# Altium footprint library Connectors_2,54mm.PcbLib: 400 footprints (part 18 of 26)
Each footprint in its own frame and in the unit in brackets; x right, y up, seen from the top. Pads: shape width x height; smd on the part's side, far side on the other; paste and mask are expansions set on the pad; w line width, h text height; cw(c..) or ccw(c..) is an arc to the next point about the centre after c.
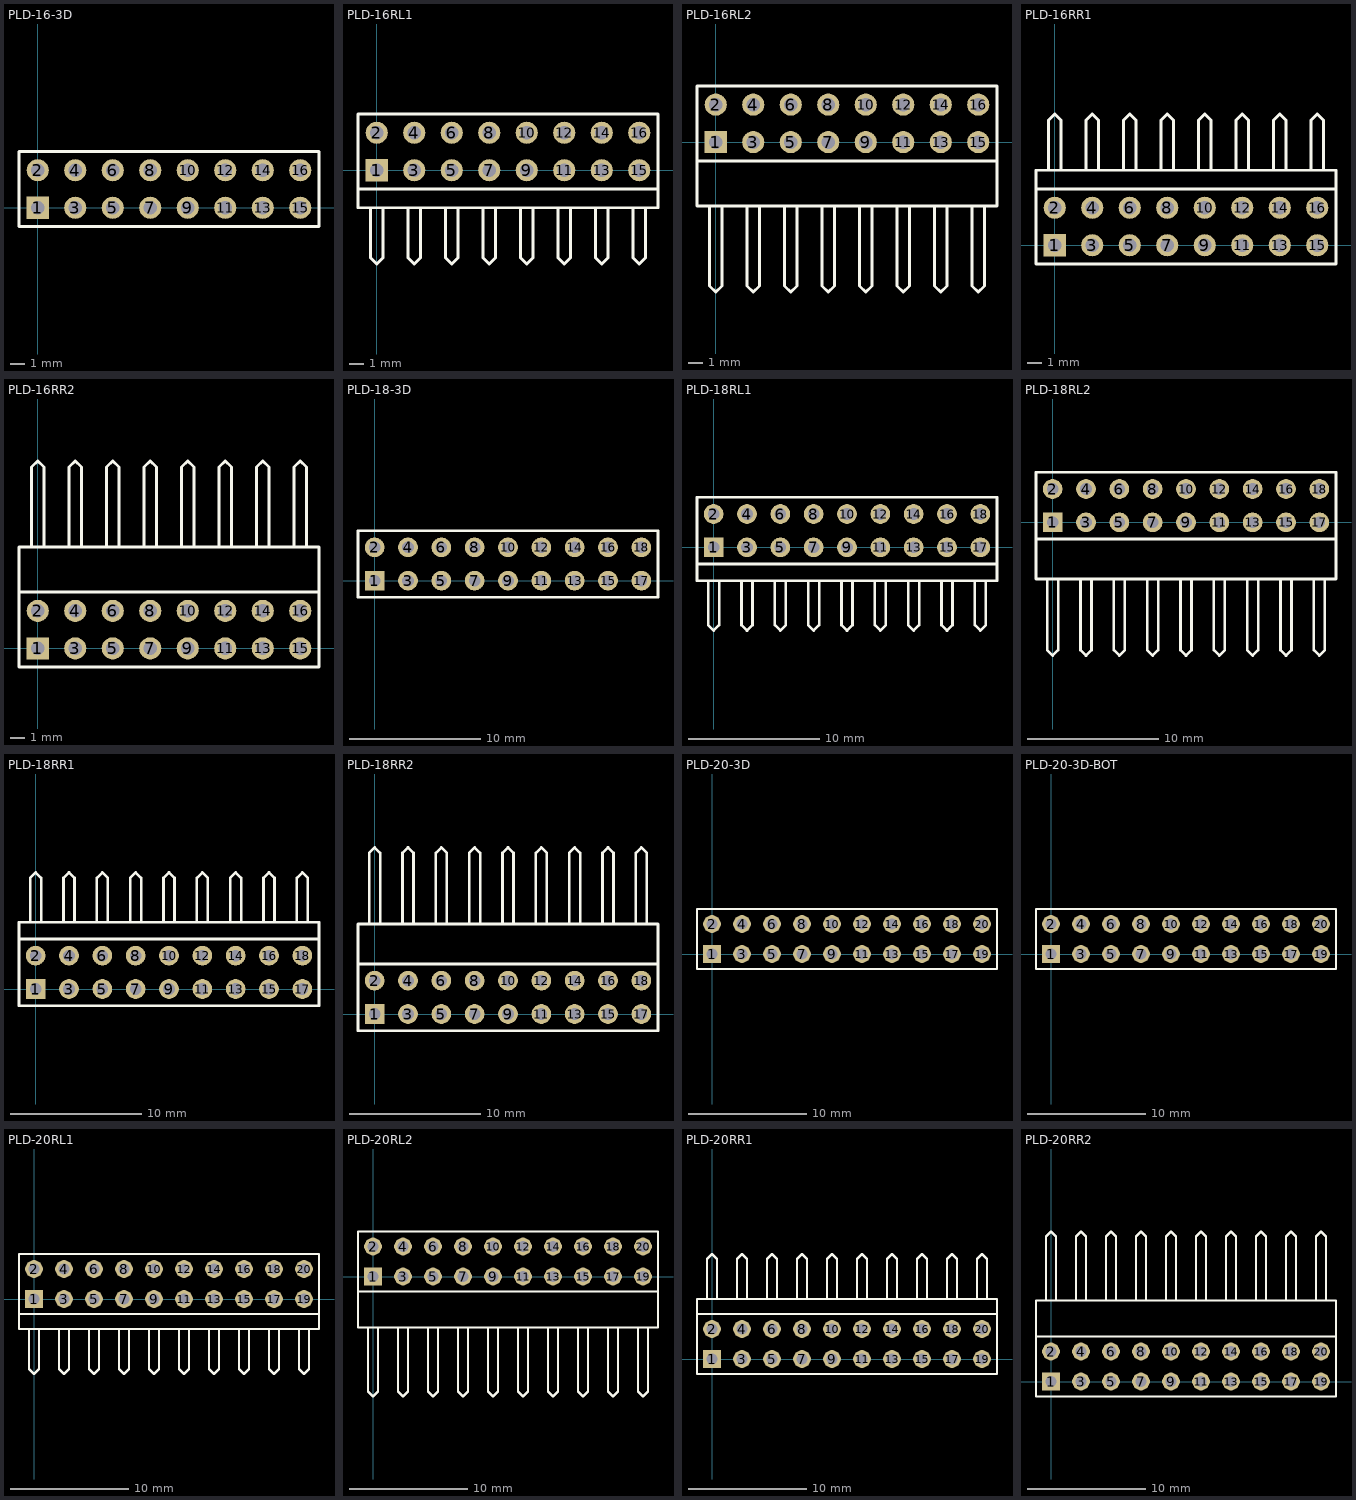
[diagram p17: the footprints below, top view; thin cyan lines are the x and y axes]

## PLD-16-3D [mm] "Connector; Header; 8x2 Position"
height 7.5
pads (16):
  rect 1.5x1.5 hole 0.9: 1(0,0)
  round 1.5 hole 0.9: 2(0,2.54) 3(2.54,0) 4(2.54,2.54) 5(5.08,0) 6(5.08,2.54) 7(7.62,0) 8(7.62,2.54) 9(10.16,0) 10(10.16,2.54) 11(12.7,0) 12(12.7,2.54) 13(15.24,0) 14(15.24,2.54) 15(17.78,0) 16(17.78,2.54)
Top Overlay:
  lines w0.2: -1.27,-1.27 19.05,-1.27 19.05,3.81 -1.27,3.81 -1.27,-1.27
3D body "PLD-16.step": height 8.4, standoff -3, extent -1.27,-1.23 19.05,3.77

## PLD-16RL1 [mm] "Connector; Header; 8x2 Position"
height 7
pads (16):
  rect 1.5x1.5 hole 0.9: 1(0,0)
  round 1.5 hole 0.9: 2(0,2.54) 3(2.54,0) 4(2.54,2.54) 5(5.08,0) 6(5.08,2.54) 7(7.62,0) 8(7.62,2.54) 9(10.16,0) 10(10.16,2.54) 11(12.7,0) 12(12.7,2.54) 13(15.24,0) 14(15.24,2.54) 15(17.78,0) 16(17.78,2.54)
Top Overlay:
  lines w0.2: -0.423,-2.54 -0.423,-5.927 0,-6.35 0.423,-5.927 0.423,-2.54 ; 2.117,-2.54 2.117,-5.927 2.54,-6.35 2.963,-5.927 2.963,-2.54 ; 4.657,-2.54 4.657,-5.927 5.08,-6.35 5.503,-5.927 5.503,-2.54 ; 7.197,-2.54 7.197,-5.927 7.62,-6.35 8.043,-5.927 8.043,-2.54 ; 9.737,-2.54 9.737,-5.927 10.16,-6.35 10.583,-5.927 10.583,-2.54 ; 12.277,-2.54 12.277,-5.927 12.7,-6.35 13.123,-5.927 13.123,-2.54 ; 14.817,-2.54 14.817,-5.927 15.24,-6.35 15.663,-5.927 15.663,-2.54 ; 17.357,-2.54 17.357,-5.927 17.78,-6.35 18.203,-5.927 18.203,-2.54 ; -1.27,-1.27 -1.27,-2.54 19.05,-2.54 19.05,-1.27 ; -1.27,-1.27 -1.27,3.81 19.05,3.81 19.05,-1.27 ; -1.27,-1.27 19.05,-1.27
3D body "PLS-1R.step": height 5.45, standoff -3, extent -1.27,-7.35 1.27,1.27
3D body "PLS-1Rr.stp": height 7.99, standoff -3, extent -1.27,-7.35 1.27,3.81
3D body "PLS-1Rr.stp": height 7.99, standoff -3, extent 1.27,-7.35 3.81,3.81
3D body "PLS-1R.step": height 5.45, standoff -3, extent 1.27,-7.35 3.81,1.27
3D body "PLS-1R.step": height 5.45, standoff -3, extent 3.81,-7.35 6.35,1.27
3D body "PLS-1Rr.stp": height 7.99, standoff -3, extent 3.81,-7.35 6.35,3.81
3D body "PLS-1Rr.stp": height 7.99, standoff -3, extent 6.35,-7.35 8.89,3.81
3D body "PLS-1R.step": height 5.45, standoff -3, extent 6.35,-7.35 8.89,1.27
3D body "PLS-1R.step": height 5.45, standoff -3, extent 8.89,-7.35 11.43,1.27
3D body "PLS-1Rr.stp": height 7.99, standoff -3, extent 8.89,-7.35 11.43,3.81
3D body "PLS-1Rr.stp": height 7.99, standoff -3, extent 11.43,-7.35 13.97,3.81
3D body "PLS-1R.step": height 5.45, standoff -3, extent 11.43,-7.35 13.97,1.27
3D body "PLS-1R.step": height 5.45, standoff -3, extent 13.97,-7.35 16.51,1.27
3D body "PLS-1Rr.stp": height 7.99, standoff -3, extent 13.97,-7.35 16.51,3.81
3D body "PLS-1Rr.stp": height 7.99, standoff -3, extent 16.51,-7.35 19.05,3.81
3D body "PLS-1R.step": height 5.45, standoff -3, extent 16.51,-7.35 19.05,1.27

## PLD-16RL2 [mm] "Connector; Header; 8x2 Position"
height 5
pads (16):
  rect 1.5x1.5 hole 0.9: 1(0,0)
  round 1.5 hole 0.9: 2(0,2.54) 3(2.54,0) 4(2.54,2.54) 5(5.08,0) 6(5.08,2.54) 7(7.62,0) 8(7.62,2.54) 9(10.16,0) 10(10.16,2.54) 11(12.7,0) 12(12.7,2.54) 13(15.24,0) 14(15.24,2.54) 15(17.78,0) 16(17.78,2.54)
Top Overlay:
  lines w0.2: -0.423,-4.318 -0.423,-9.737 0,-10.16 0.423,-9.737 0.423,-4.318 ; 2.117,-4.318 2.117,-9.737 2.54,-10.16 2.963,-9.737 2.963,-4.318 ; 4.657,-4.318 4.657,-9.737 5.08,-10.16 5.503,-9.737 5.503,-4.318 ; 7.197,-4.318 7.197,-9.737 7.62,-10.16 8.043,-9.737 8.043,-4.318 ; 9.737,-4.318 9.737,-9.737 10.16,-10.16 10.583,-9.737 10.583,-4.318 ; 12.277,-4.318 12.277,-9.737 12.7,-10.16 13.123,-9.737 13.123,-4.318 ; 14.817,-4.318 14.817,-9.737 15.24,-10.16 15.663,-9.737 15.663,-4.318 ; 17.357,-4.318 17.357,-9.737 17.78,-10.16 18.203,-9.737 18.203,-4.318 ; 19.05,-1.27 -1.27,-1.27 ; -1.27,-1.27 -1.27,3.81 19.05,3.81 19.05,-4.318 -1.27,-4.318 -1.27,-1.27
3D body "PLD-R2.stp": height 5.08, standoff -2.6, extent 6.35,-9.976 8.89,2.864
3D body "PLD-R2.stp": height 5.08, standoff -2.6, extent 8.89,-9.976 11.43,2.864
3D body "PLD-R2.stp": height 5.08, standoff -2.6, extent 11.43,-9.976 13.97,2.864
3D body "PLD-R2.stp": height 5.08, standoff -2.6, extent -1.27,-9.976 1.27,2.864
3D body "PLD-R2.stp": height 5.08, standoff -2.6, extent 1.27,-9.976 3.81,2.864
3D body "PLD-R2.stp": height 5.08, standoff -2.6, extent 3.81,-9.976 6.35,2.864
3D body "PLD-R2.stp": height 5.08, standoff -2.6, extent 13.97,-9.976 16.51,2.864
3D body "PLD-R2.stp": height 5.08, standoff -2.6, extent 16.51,-9.976 19.05,2.864

## PLD-16RR1 [mm] "Connector; Header; 8x2 Position"
height 7
pads (16):
  rect 1.5x1.5 hole 0.9: 1(0,0)
  round 1.5 hole 0.9: 2(0,2.54) 3(2.54,0) 4(2.54,2.54) 5(5.08,0) 6(5.08,2.54) 7(7.62,0) 8(7.62,2.54) 9(10.16,0) 10(10.16,2.54) 11(12.7,0) 12(12.7,2.54) 13(15.24,0) 14(15.24,2.54) 15(17.78,0) 16(17.78,2.54)
Top Overlay:
  lines w0.2: -0.423,5.08 -0.423,8.467 0,8.89 0.423,8.467 0.423,5.08 ; 2.117,5.08 2.117,8.467 2.54,8.89 2.963,8.467 2.963,5.08 ; 4.657,5.08 4.657,8.467 5.08,8.89 5.503,8.467 5.503,5.08 ; 7.197,5.08 7.197,8.467 7.62,8.89 8.043,8.467 8.043,5.08 ; 9.737,5.08 9.737,8.467 10.16,8.89 10.583,8.467 10.583,5.08 ; 12.277,5.08 12.277,8.467 12.7,8.89 13.123,8.467 13.123,5.08 ; 14.817,5.08 14.817,8.467 15.24,8.89 15.663,8.467 15.663,5.08 ; 17.357,5.08 17.357,8.467 17.78,8.89 18.203,8.467 18.203,5.08 ; -1.27,3.81 -1.27,5.08 19.05,5.08 19.05,3.81 ; -1.27,3.81 -1.27,-1.27 19.05,-1.27 19.05,3.81 ; -1.27,3.81 19.05,3.81
3D body "PLS-1R.step": height 5.45, standoff -3, extent 1.27,1.27 3.81,9.89
3D body "PLS-1Rr.stp": height 7.99, standoff -3, extent 1.27,-1.27 3.81,9.89
3D body "PLS-1Rr.stp": height 7.99, standoff -3, extent -1.27,-1.27 1.27,9.89
3D body "PLS-1R.step": height 5.45, standoff -3, extent -1.27,1.27 1.27,9.89
3D body "PLS-1R.step": height 5.45, standoff -3, extent 6.35,1.27 8.89,9.89
3D body "PLS-1Rr.stp": height 7.99, standoff -3, extent 6.35,-1.27 8.89,9.89
3D body "PLS-1Rr.stp": height 7.99, standoff -3, extent 3.81,-1.27 6.35,9.89
3D body "PLS-1R.step": height 5.45, standoff -3, extent 3.81,1.27 6.35,9.89
3D body "PLS-1R.step": height 5.45, standoff -3, extent 11.43,1.27 13.97,9.89
3D body "PLS-1Rr.stp": height 7.99, standoff -3, extent 11.43,-1.27 13.97,9.89
3D body "PLS-1Rr.stp": height 7.99, standoff -3, extent 8.89,-1.27 11.43,9.89
3D body "PLS-1R.step": height 5.45, standoff -3, extent 8.89,1.27 11.43,9.89
3D body "PLS-1R.step": height 5.45, standoff -3, extent 16.51,1.27 19.05,9.89
3D body "PLS-1Rr.stp": height 7.99, standoff -3, extent 16.51,-1.27 19.05,9.89
3D body "PLS-1Rr.stp": height 7.99, standoff -3, extent 13.97,-1.27 16.51,9.89
3D body "PLS-1R.step": height 5.45, standoff -3, extent 13.97,1.27 16.51,9.89

## PLD-16RR2 [mm] "Connector; Header; 8x2 Position"
height 5
pads (16):
  rect 1.5x1.5 hole 0.9: 1(0,0)
  round 1.5 hole 0.9: 2(0,2.54) 3(2.54,0) 4(2.54,2.54) 5(5.08,0) 6(5.08,2.54) 7(7.62,0) 8(7.62,2.54) 9(10.16,0) 10(10.16,2.54) 11(12.7,0) 12(12.7,2.54) 13(15.24,0) 14(15.24,2.54) 15(17.78,0) 16(17.78,2.54)
Top Overlay:
  lines w0.2: -0.423,6.858 -0.423,12.277 0,12.7 0.423,12.277 0.423,6.858 ; 2.117,6.858 2.117,12.277 2.54,12.7 2.963,12.277 2.963,6.858 ; 4.657,6.858 4.657,12.277 5.08,12.7 5.503,12.277 5.503,6.858 ; 7.197,6.858 7.197,12.277 7.62,12.7 8.043,12.277 8.043,6.858 ; 9.737,6.858 9.737,12.277 10.16,12.7 10.583,12.277 10.583,6.858 ; 12.277,6.858 12.277,12.277 12.7,12.7 13.123,12.277 13.123,6.858 ; 14.817,6.858 14.817,12.277 15.24,12.7 15.663,12.277 15.663,6.858 ; 17.357,6.858 17.357,12.277 17.78,12.7 18.203,12.277 18.203,6.858 ; 19.05,3.81 -1.27,3.81 ; -1.27,3.81 -1.27,6.858 19.05,6.858 19.05,-1.27 -1.27,-1.27 -1.27,3.81
3D body "PLD-R2.stp": height 5.08, standoff -2.6, extent 16.51,-0.324 19.05,12.516
3D body "PLD-R2.stp": height 5.08, standoff -2.6, extent 13.97,-0.324 16.51,12.516
3D body "PLD-R2.stp": height 5.08, standoff -2.6, extent 3.81,-0.324 6.35,12.516
3D body "PLD-R2.stp": height 5.08, standoff -2.6, extent 1.27,-0.324 3.81,12.516
3D body "PLD-R2.stp": height 5.08, standoff -2.6, extent -1.27,-0.324 1.27,12.516
3D body "PLD-R2.stp": height 5.08, standoff -2.6, extent 11.43,-0.324 13.97,12.516
3D body "PLD-R2.stp": height 5.08, standoff -2.6, extent 8.89,-0.324 11.43,12.516
3D body "PLD-R2.stp": height 5.08, standoff -2.6, extent 6.35,-0.324 8.89,12.516

## PLD-18-3D [mm] "Connector; Header; 9x2 Position"
height 7.5
pads (18):
  rect 1.5x1.5 hole 0.9: 1(0,0)
  round 1.5 hole 0.9: 2(0,2.54) 3(2.54,0) 4(2.54,2.54) 5(5.08,0) 6(5.08,2.54) 7(7.62,0) 8(7.62,2.54) 9(10.16,0) 10(10.16,2.54) 11(12.7,0) 12(12.7,2.54) 13(15.24,0) 14(15.24,2.54) 15(17.78,0) 16(17.78,2.54) 17(20.32,0) 18(20.32,2.54)
Top Overlay:
  lines w0.2: -1.27,-1.27 -1.27,3.81 21.59,3.81 21.59,-1.27 -1.27,-1.27
3D body "PLD-18.step": height 8.4, standoff -3, extent -1.27,-1.23 21.59,3.77

## PLD-18RL1 [mm] "Connector; Header; 9x2 Position"
height 7
pads (18):
  rect 1.5x1.5 hole 0.9: 1(0,0)
  round 1.5 hole 0.9: 2(0,2.54) 3(2.54,0) 4(2.54,2.54) 5(5.08,0) 6(5.08,2.54) 7(7.62,0) 8(7.62,2.54) 9(10.16,0) 10(10.16,2.54) 11(12.7,0) 12(12.7,2.54) 13(15.24,0) 14(15.24,2.54) 15(17.78,0) 16(17.78,2.54) 17(20.32,0) 18(20.32,2.54)
Top Overlay:
  lines w0.2: -0.423,-2.54 -0.423,-5.927 0,-6.35 0.423,-5.927 0.423,-2.54 ; 2.117,-2.54 2.117,-5.927 2.54,-6.35 2.963,-5.927 2.963,-2.54 ; 4.657,-2.54 4.657,-5.927 5.08,-6.35 5.503,-5.927 5.503,-2.54 ; 7.197,-2.54 7.197,-5.927 7.62,-6.35 8.043,-5.927 8.043,-2.54 ; 9.737,-2.54 9.737,-5.927 10.16,-6.35 10.583,-5.927 10.583,-2.54 ; 12.277,-2.54 12.277,-5.927 12.7,-6.35 13.123,-5.927 13.123,-2.54 ; 14.817,-2.54 14.817,-5.927 15.24,-6.35 15.663,-5.927 15.663,-2.54 ; 17.357,-2.54 17.357,-5.927 17.78,-6.35 18.203,-5.927 18.203,-2.54 ; 19.897,-2.54 19.897,-5.927 20.32,-6.35 20.743,-5.927 20.743,-2.54 ; -1.27,-1.27 -1.27,3.81 21.59,3.81 21.59,-1.27 ; -1.27,-1.27 21.59,-1.27 ; -1.27,-1.27 -1.27,-2.54 21.59,-2.54 21.59,-1.27
3D body "PLS-1Rr.stp": height 7.99, standoff -3, extent 19.05,-7.35 21.59,3.81
3D body "PLS-1R.step": height 5.45, standoff -3, extent 19.05,-7.35 21.59,1.27
3D body "PLS-1R.step": height 5.45, standoff -3, extent -1.27,-7.35 1.27,1.27
3D body "PLS-1Rr.stp": height 7.99, standoff -3, extent -1.27,-7.35 1.27,3.81
3D body "PLS-1Rr.stp": height 7.99, standoff -3, extent 1.27,-7.35 3.81,3.81
3D body "PLS-1R.step": height 5.45, standoff -3, extent 1.27,-7.35 3.81,1.27
3D body "PLS-1R.step": height 5.45, standoff -3, extent 3.81,-7.35 6.35,1.27
3D body "PLS-1Rr.stp": height 7.99, standoff -3, extent 3.81,-7.35 6.35,3.81
3D body "PLS-1Rr.stp": height 7.99, standoff -3, extent 6.35,-7.35 8.89,3.81
3D body "PLS-1R.step": height 5.45, standoff -3, extent 6.35,-7.35 8.89,1.27
3D body "PLS-1R.step": height 5.45, standoff -3, extent 8.89,-7.35 11.43,1.27
3D body "PLS-1Rr.stp": height 7.99, standoff -3, extent 8.89,-7.35 11.43,3.81
3D body "PLS-1Rr.stp": height 7.99, standoff -3, extent 11.43,-7.35 13.97,3.81
3D body "PLS-1R.step": height 5.45, standoff -3, extent 11.43,-7.35 13.97,1.27
3D body "PLS-1R.step": height 5.45, standoff -3, extent 13.97,-7.35 16.51,1.27
3D body "PLS-1Rr.stp": height 7.99, standoff -3, extent 13.97,-7.35 16.51,3.81
3D body "PLS-1Rr.stp": height 7.99, standoff -3, extent 16.51,-7.35 19.05,3.81
3D body "PLS-1R.step": height 5.45, standoff -3, extent 16.51,-7.35 19.05,1.27

## PLD-18RL2 [mm] "Connector; Header; 9x2 Position"
height 5
pads (18):
  rect 1.5x1.5 hole 0.9: 1(0,0)
  round 1.5 hole 0.9: 2(0,2.54) 3(2.54,0) 4(2.54,2.54) 5(5.08,0) 6(5.08,2.54) 7(7.62,0) 8(7.62,2.54) 9(10.16,0) 10(10.16,2.54) 11(12.7,0) 12(12.7,2.54) 13(15.24,0) 14(15.24,2.54) 15(17.78,0) 16(17.78,2.54) 17(20.32,0) 18(20.32,2.54)
Top Overlay:
  lines w0.2: -0.423,-4.318 -0.423,-9.737 0,-10.16 0.423,-9.737 0.423,-4.318 ; 2.117,-4.318 2.117,-9.737 2.54,-10.16 2.963,-9.737 2.963,-4.318 ; 4.657,-4.318 4.657,-9.737 5.08,-10.16 5.503,-9.737 5.503,-4.318 ; 7.197,-4.318 7.197,-9.737 7.62,-10.16 8.043,-9.737 8.043,-4.318 ; 9.737,-4.318 9.737,-9.737 10.16,-10.16 10.583,-9.737 10.583,-4.318 ; 12.277,-4.318 12.277,-9.737 12.7,-10.16 13.123,-9.737 13.123,-4.318 ; 14.817,-4.318 14.817,-9.737 15.24,-10.16 15.663,-9.737 15.663,-4.318 ; 17.357,-4.318 17.357,-9.737 17.78,-10.16 18.203,-9.737 18.203,-4.318 ; 19.897,-4.318 19.897,-9.737 20.32,-10.16 20.743,-9.737 20.743,-4.318 ; 21.59,-1.27 -1.27,-1.27 ; -1.27,-1.27 -1.27,3.81 21.59,3.81 21.59,-4.318 -1.27,-4.318 -1.27,-1.27
3D body "PLD-R2.stp": height 5.08, standoff -2.6, extent 3.81,-9.976 6.35,2.864
3D body "PLD-R2.stp": height 5.08, standoff -2.6, extent 1.27,-9.976 3.81,2.864
3D body "PLD-R2.stp": height 5.08, standoff -2.6, extent -1.27,-9.976 1.27,2.864
3D body "PLD-R2.stp": height 5.08, standoff -2.6, extent 11.43,-9.976 13.97,2.864
3D body "PLD-R2.stp": height 5.08, standoff -2.6, extent 8.89,-9.976 11.43,2.864
3D body "PLD-R2.stp": height 5.08, standoff -2.6, extent 6.35,-9.976 8.89,2.864
3D body "PLD-R2.stp": height 5.08, standoff -2.6, extent 19.05,-9.976 21.59,2.864
3D body "PLD-R2.stp": height 5.08, standoff -2.6, extent 16.51,-9.976 19.05,2.864
3D body "PLD-R2.stp": height 5.08, standoff -2.6, extent 13.97,-9.976 16.51,2.864

## PLD-18RR1 [mm] "Connector; Header; 9x2 Position"
height 7
pads (18):
  rect 1.5x1.5 hole 0.9: 1(0,0)
  round 1.5 hole 0.9: 2(0,2.54) 3(2.54,0) 4(2.54,2.54) 5(5.08,0) 6(5.08,2.54) 7(7.62,0) 8(7.62,2.54) 9(10.16,0) 10(10.16,2.54) 11(12.7,0) 12(12.7,2.54) 13(15.24,0) 14(15.24,2.54) 15(17.78,0) 16(17.78,2.54) 17(20.32,0) 18(20.32,2.54)
Top Overlay:
  lines w0.2: -0.423,5.08 -0.423,8.467 0,8.89 0.423,8.467 0.423,5.08 ; 2.117,5.08 2.117,8.467 2.54,8.89 2.963,8.467 2.963,5.08 ; 4.657,5.08 4.657,8.467 5.08,8.89 5.503,8.467 5.503,5.08 ; 7.197,5.08 7.197,8.467 7.62,8.89 8.043,8.467 8.043,5.08 ; 9.737,5.08 9.737,8.467 10.16,8.89 10.583,8.467 10.583,5.08 ; 12.277,5.08 12.277,8.467 12.7,8.89 13.123,8.467 13.123,5.08 ; 14.817,5.08 14.817,8.467 15.24,8.89 15.663,8.467 15.663,5.08 ; 17.357,5.08 17.357,8.467 17.78,8.89 18.203,8.467 18.203,5.08 ; 19.897,5.08 19.897,8.467 20.32,8.89 20.743,8.467 20.743,5.08 ; -1.27,3.81 -1.27,5.08 21.59,5.08 21.59,3.81 ; -1.27,3.81 21.59,3.81 ; -1.27,3.81 -1.27,-1.27 21.59,-1.27 21.59,3.81
3D body "PLS-1Rr.stp": height 7.99, standoff -3, extent 19.05,-1.27 21.59,9.89
3D body "PLS-1R.step": height 5.45, standoff -3, extent 19.05,1.27 21.59,9.89
3D body "PLS-1R.step": height 5.45, standoff -3, extent 1.27,1.27 3.81,9.89
3D body "PLS-1Rr.stp": height 7.99, standoff -3, extent 1.27,-1.27 3.81,9.89
3D body "PLS-1Rr.stp": height 7.99, standoff -3, extent -1.27,-1.27 1.27,9.89
3D body "PLS-1R.step": height 5.45, standoff -3, extent -1.27,1.27 1.27,9.89
3D body "PLS-1R.step": height 5.45, standoff -3, extent 6.35,1.27 8.89,9.89
3D body "PLS-1Rr.stp": height 7.99, standoff -3, extent 6.35,-1.27 8.89,9.89
3D body "PLS-1Rr.stp": height 7.99, standoff -3, extent 3.81,-1.27 6.35,9.89
3D body "PLS-1R.step": height 5.45, standoff -3, extent 3.81,1.27 6.35,9.89
3D body "PLS-1R.step": height 5.45, standoff -3, extent 11.43,1.27 13.97,9.89
3D body "PLS-1Rr.stp": height 7.99, standoff -3, extent 11.43,-1.27 13.97,9.89
3D body "PLS-1Rr.stp": height 7.99, standoff -3, extent 8.89,-1.27 11.43,9.89
3D body "PLS-1R.step": height 5.45, standoff -3, extent 8.89,1.27 11.43,9.89
3D body "PLS-1R.step": height 5.45, standoff -3, extent 16.51,1.27 19.05,9.89
3D body "PLS-1Rr.stp": height 7.99, standoff -3, extent 16.51,-1.27 19.05,9.89
3D body "PLS-1Rr.stp": height 7.99, standoff -3, extent 13.97,-1.27 16.51,9.89
3D body "PLS-1R.step": height 5.45, standoff -3, extent 13.97,1.27 16.51,9.89

## PLD-18RR2 [mm] "Connector; Header; 9x2 Position"
height 5
pads (18):
  rect 1.5x1.5 hole 0.9: 1(0,0)
  round 1.5 hole 0.9: 2(0,2.54) 3(2.54,0) 4(2.54,2.54) 5(5.08,0) 6(5.08,2.54) 7(7.62,0) 8(7.62,2.54) 9(10.16,0) 10(10.16,2.54) 11(12.7,0) 12(12.7,2.54) 13(15.24,0) 14(15.24,2.54) 15(17.78,0) 16(17.78,2.54) 17(20.32,0) 18(20.32,2.54)
Top Overlay:
  lines w0.2: -0.423,6.858 -0.423,12.277 0,12.7 0.423,12.277 0.423,6.858 ; 2.117,6.858 2.117,12.277 2.54,12.7 2.963,12.277 2.963,6.858 ; 4.657,6.858 4.657,12.277 5.08,12.7 5.503,12.277 5.503,6.858 ; 7.197,6.858 7.197,12.277 7.62,12.7 8.043,12.277 8.043,6.858 ; 9.737,6.858 9.737,12.277 10.16,12.7 10.583,12.277 10.583,6.858 ; 12.277,6.858 12.277,12.277 12.7,12.7 13.123,12.277 13.123,6.858 ; 14.817,6.858 14.817,12.277 15.24,12.7 15.663,12.277 15.663,6.858 ; 17.357,6.858 17.357,12.277 17.78,12.7 18.203,12.277 18.203,6.858 ; 19.897,6.858 19.897,12.277 20.32,12.7 20.743,12.277 20.743,6.858 ; 21.59,3.81 -1.27,3.81 ; -1.27,3.81 -1.27,-1.27 21.59,-1.27 21.59,6.858 -1.27,6.858 -1.27,3.81
3D body "PLD-R2.stp": height 5.08, standoff -2.6, extent 3.81,-0.324 6.35,12.516
3D body "PLD-R2.stp": height 5.08, standoff -2.6, extent 1.27,-0.324 3.81,12.516
3D body "PLD-R2.stp": height 5.08, standoff -2.6, extent -1.27,-0.324 1.27,12.516
3D body "PLD-R2.stp": height 5.08, standoff -2.6, extent 11.43,-0.324 13.97,12.516
3D body "PLD-R2.stp": height 5.08, standoff -2.6, extent 8.89,-0.324 11.43,12.516
3D body "PLD-R2.stp": height 5.08, standoff -2.6, extent 6.35,-0.324 8.89,12.516
3D body "PLD-R2.stp": height 5.08, standoff -2.6, extent 19.05,-0.324 21.59,12.516
3D body "PLD-R2.stp": height 5.08, standoff -2.6, extent 16.51,-0.324 19.05,12.516
3D body "PLD-R2.stp": height 5.08, standoff -2.6, extent 13.97,-0.324 16.51,12.516

## PLD-20-3D [mm] "Connector; Header; 10x2 Position"
height 7.5
pads (20):
  rect 1.5x1.5 hole 0.9: 1(0,0)
  round 1.5 hole 0.9: 2(0,2.54) 3(2.54,0) 4(2.54,2.54) 5(5.08,0) 6(5.08,2.54) 7(7.62,0) 8(7.62,2.54) 9(10.16,0) 10(10.16,2.54) 11(12.7,0) 12(12.7,2.54) 13(15.24,0) 14(15.24,2.54) 15(17.78,0) 16(17.78,2.54) 17(20.32,0) 18(20.32,2.54) 19(22.86,0) 20(22.86,2.54)
Top Overlay:
  lines w0.2: -1.27,-1.27 0.635,-1.27 24.13,-1.27 24.13,3.81 0.635,3.81 -1.27,3.81 -1.27,-1.27
3D body "PLD-20.step": height 8.4, standoff -3, extent -1.27,-1.23 24.13,3.77

## PLD-20-3D-BOT [mm] "Connector; Header; 10x2 Position"
height 7.5
pads (20):
  rect 1.5x1.5 hole 0.9: 1(0,0)
  round 1.5 hole 0.9: 2(0,2.54) 3(2.54,0) 4(2.54,2.54) 5(5.08,0) 6(5.08,2.54) 7(7.62,0) 8(7.62,2.54) 9(10.16,0) 10(10.16,2.54) 11(12.7,0) 12(12.7,2.54) 13(15.24,0) 14(15.24,2.54) 15(17.78,0) 16(17.78,2.54) 17(20.32,0) 18(20.32,2.54) 19(22.86,0) 20(22.86,2.54)
Top Overlay:
  lines w0.2: -1.27,-1.27 0.635,-1.27 24.13,-1.27 24.13,3.81 0.635,3.81 -1.27,3.81 -1.27,-1.27
3D body "PLD-20.step": height 2.5, standoff -8.9, extent -1.27,-1.23 24.13,3.77

## PLD-20RL1 [mm] "Connector; Header; 10x2 Position"
height 7
pads (20):
  rect 1.5x1.5 hole 0.9: 1(0,0)
  round 1.5 hole 0.9: 2(0,2.54) 3(2.54,0) 4(2.54,2.54) 5(5.08,0) 6(5.08,2.54) 7(7.62,0) 8(7.62,2.54) 9(10.16,0) 10(10.16,2.54) 11(12.7,0) 12(12.7,2.54) 13(15.24,0) 14(15.24,2.54) 15(17.78,0) 16(17.78,2.54) 17(20.32,0) 18(20.32,2.54) 19(22.86,0) 20(22.86,2.54)
Top Overlay:
  lines w0.2: -0.423,-2.54 -0.423,-5.927 0,-6.35 0.423,-5.927 0.423,-2.54 ; 2.117,-2.54 2.117,-5.927 2.54,-6.35 2.963,-5.927 2.963,-2.54 ; 4.657,-2.54 4.657,-5.927 5.08,-6.35 5.503,-5.927 5.503,-2.54 ; 7.197,-2.54 7.197,-5.927 7.62,-6.35 8.043,-5.927 8.043,-2.54 ; 9.737,-2.54 9.737,-5.927 10.16,-6.35 10.583,-5.927 10.583,-2.54 ; 12.277,-2.54 12.277,-5.927 12.7,-6.35 13.123,-5.927 13.123,-2.54 ; 14.817,-2.54 14.817,-5.927 15.24,-6.35 15.663,-5.927 15.663,-2.54 ; 17.357,-2.54 17.357,-5.927 17.78,-6.35 18.203,-5.927 18.203,-2.54 ; 19.897,-2.54 19.897,-5.927 20.32,-6.35 20.743,-5.927 20.743,-2.54 ; 22.437,-2.54 22.437,-5.927 22.86,-6.35 23.283,-5.927 23.283,-2.54 ; -1.27,-1.27 -1.27,-2.54 24.13,-2.54 24.13,-1.27 ; -1.27,-1.27 24.13,-1.27 ; -1.27,-1.27 -1.27,3.81 24.13,3.81 24.13,-1.27
3D body "PLS-1R.step": height 5.45, standoff -3, extent -1.27,-7.35 1.27,1.27
3D body "PLS-1Rr.stp": height 7.99, standoff -3, extent -1.27,-7.35 1.27,3.81
3D body "PLS-1Rr.stp": height 7.99, standoff -3, extent 1.27,-7.35 3.81,3.81
3D body "PLS-1R.step": height 5.45, standoff -3, extent 1.27,-7.35 3.81,1.27
3D body "PLS-1R.step": height 5.45, standoff -3, extent 3.81,-7.35 6.35,1.27
3D body "PLS-1Rr.stp": height 7.99, standoff -3, extent 3.81,-7.35 6.35,3.81
3D body "PLS-1Rr.stp": height 7.99, standoff -3, extent 6.35,-7.35 8.89,3.81
3D body "PLS-1R.step": height 5.45, standoff -3, extent 6.35,-7.35 8.89,1.27
3D body "PLS-1R.step": height 5.45, standoff -3, extent 8.89,-7.35 11.43,1.27
3D body "PLS-1Rr.stp": height 7.99, standoff -3, extent 8.89,-7.35 11.43,3.81
3D body "PLS-1Rr.stp": height 7.99, standoff -3, extent 11.43,-7.35 13.97,3.81
3D body "PLS-1R.step": height 5.45, standoff -3, extent 11.43,-7.35 13.97,1.27
3D body "PLS-1R.step": height 5.45, standoff -3, extent 13.97,-7.35 16.51,1.27
3D body "PLS-1Rr.stp": height 7.99, standoff -3, extent 13.97,-7.35 16.51,3.81
3D body "PLS-1Rr.stp": height 7.99, standoff -3, extent 16.51,-7.35 19.05,3.81
3D body "PLS-1R.step": height 5.45, standoff -3, extent 16.51,-7.35 19.05,1.27
3D body "PLS-1R.step": height 5.45, standoff -3, extent 19.05,-7.35 21.59,1.27
3D body "PLS-1Rr.stp": height 7.99, standoff -3, extent 19.05,-7.35 21.59,3.81
3D body "PLS-1Rr.stp": height 7.99, standoff -3, extent 21.59,-7.35 24.13,3.81
3D body "PLS-1R.step": height 5.45, standoff -3, extent 21.59,-7.35 24.13,1.27

## PLD-20RL2 [mm] "Connector; Header; 10x2 Position"
height 5
pads (20):
  rect 1.5x1.5 hole 0.9: 1(0,0)
  round 1.5 hole 0.9: 2(0,2.54) 3(2.54,0) 4(2.54,2.54) 5(5.08,0) 6(5.08,2.54) 7(7.62,0) 8(7.62,2.54) 9(10.16,0) 10(10.16,2.54) 11(12.7,0) 12(12.7,2.54) 13(15.24,0) 14(15.24,2.54) 15(17.78,0) 16(17.78,2.54) 17(20.32,0) 18(20.32,2.54) 19(22.86,0) 20(22.86,2.54)
Top Overlay:
  lines w0.2: -0.423,-4.318 -0.423,-9.737 0,-10.16 0.423,-9.737 0.423,-4.318 ; 2.117,-4.318 2.117,-9.737 2.54,-10.16 2.963,-9.737 2.963,-4.318 ; 4.657,-4.318 4.657,-9.737 5.08,-10.16 5.503,-9.737 5.503,-4.318 ; 7.197,-4.318 7.197,-9.737 7.62,-10.16 8.043,-9.737 8.043,-4.318 ; 9.737,-4.318 9.737,-9.737 10.16,-10.16 10.583,-9.737 10.583,-4.318 ; 12.277,-4.318 12.277,-9.737 12.7,-10.16 13.123,-9.737 13.123,-4.318 ; 14.817,-4.318 14.817,-9.737 15.24,-10.16 15.663,-9.737 15.663,-4.318 ; 17.357,-4.318 17.357,-9.737 17.78,-10.16 18.203,-9.737 18.203,-4.318 ; 19.897,-4.318 19.897,-9.737 20.32,-10.16 20.743,-9.737 20.743,-4.318 ; 22.437,-4.318 22.437,-9.737 22.86,-10.16 23.283,-9.737 23.283,-4.318 ; 24.13,-1.27 -1.27,-1.27 ; -1.27,-1.27 -1.27,3.81 24.13,3.81 24.13,-4.318 -1.27,-4.318 -1.27,-1.27
3D body "PLD-R2.stp": height 5.08, standoff -2.6, extent 21.59,-9.976 24.13,2.864
3D body "PLD-R2.stp": height 5.08, standoff -2.6, extent 3.81,-9.976 6.35,2.864
3D body "PLD-R2.stp": height 5.08, standoff -2.6, extent 1.27,-9.976 3.81,2.864
3D body "PLD-R2.stp": height 5.08, standoff -2.6, extent -1.27,-9.976 1.27,2.864
3D body "PLD-R2.stp": height 5.08, standoff -2.6, extent 11.43,-9.976 13.97,2.864
3D body "PLD-R2.stp": height 5.08, standoff -2.6, extent 8.89,-9.976 11.43,2.864
3D body "PLD-R2.stp": height 5.08, standoff -2.6, extent 6.35,-9.976 8.89,2.864
3D body "PLD-R2.stp": height 5.08, standoff -2.6, extent 19.05,-9.976 21.59,2.864
3D body "PLD-R2.stp": height 5.08, standoff -2.6, extent 16.51,-9.976 19.05,2.864
3D body "PLD-R2.stp": height 5.08, standoff -2.6, extent 13.97,-9.976 16.51,2.864

## PLD-20RR1 [mm] "Connector; Header; 10x2 Position"
height 7
pads (20):
  rect 1.5x1.5 hole 0.9: 1(0,0)
  round 1.5 hole 0.9: 2(0,2.54) 3(2.54,0) 4(2.54,2.54) 5(5.08,0) 6(5.08,2.54) 7(7.62,0) 8(7.62,2.54) 9(10.16,0) 10(10.16,2.54) 11(12.7,0) 12(12.7,2.54) 13(15.24,0) 14(15.24,2.54) 15(17.78,0) 16(17.78,2.54) 17(20.32,0) 18(20.32,2.54) 19(22.86,0) 20(22.86,2.54)
Top Overlay:
  lines w0.2: -0.423,5.08 -0.423,8.467 0,8.89 0.423,8.467 0.423,5.08 ; 2.117,5.08 2.117,8.467 2.54,8.89 2.963,8.467 2.963,5.08 ; 4.657,5.08 4.657,8.467 5.08,8.89 5.503,8.467 5.503,5.08 ; 7.197,5.08 7.197,8.467 7.62,8.89 8.043,8.467 8.043,5.08 ; 9.737,5.08 9.737,8.467 10.16,8.89 10.583,8.467 10.583,5.08 ; 12.277,5.08 12.277,8.467 12.7,8.89 13.123,8.467 13.123,5.08 ; 14.817,5.08 14.817,8.467 15.24,8.89 15.663,8.467 15.663,5.08 ; 17.357,5.08 17.357,8.467 17.78,8.89 18.203,8.467 18.203,5.08 ; 19.897,5.08 19.897,8.467 20.32,8.89 20.743,8.467 20.743,5.08 ; 22.437,5.08 22.437,8.467 22.86,8.89 23.283,8.467 23.283,5.08 ; -1.27,3.81 -1.27,5.08 24.13,5.08 24.13,3.81 ; -1.27,3.81 24.13,3.81 ; -1.27,3.81 -1.27,-1.27 24.13,-1.27 24.13,3.81
3D body "PLS-1R.step": height 5.45, standoff -3, extent 19.05,1.27 21.59,9.89
3D body "PLS-1Rr.stp": height 7.99, standoff -3, extent 19.05,-1.27 21.59,9.89
3D body "PLS-1Rr.stp": height 7.99, standoff -3, extent 21.59,-1.27 24.13,9.89
3D body "PLS-1R.step": height 5.45, standoff -3, extent 21.59,1.27 24.13,9.89
3D body "PLS-1R.step": height 5.45, standoff -3, extent 13.97,1.27 16.51,9.89
3D body "PLS-1Rr.stp": height 7.99, standoff -3, extent 13.97,-1.27 16.51,9.89
3D body "PLS-1Rr.stp": height 7.99, standoff -3, extent 16.51,-1.27 19.05,9.89
3D body "PLS-1R.step": height 5.45, standoff -3, extent 16.51,1.27 19.05,9.89
3D body "PLS-1R.step": height 5.45, standoff -3, extent 8.89,1.27 11.43,9.89
3D body "PLS-1Rr.stp": height 7.99, standoff -3, extent 8.89,-1.27 11.43,9.89
3D body "PLS-1Rr.stp": height 7.99, standoff -3, extent 11.43,-1.27 13.97,9.89
3D body "PLS-1R.step": height 5.45, standoff -3, extent 11.43,1.27 13.97,9.89
3D body "PLS-1R.step": height 5.45, standoff -3, extent 3.81,1.27 6.35,9.89
3D body "PLS-1Rr.stp": height 7.99, standoff -3, extent 3.81,-1.27 6.35,9.89
3D body "PLS-1Rr.stp": height 7.99, standoff -3, extent 6.35,-1.27 8.89,9.89
3D body "PLS-1R.step": height 5.45, standoff -3, extent 6.35,1.27 8.89,9.89
3D body "PLS-1R.step": height 5.45, standoff -3, extent -1.27,1.27 1.27,9.89
3D body "PLS-1Rr.stp": height 7.99, standoff -3, extent -1.27,-1.27 1.27,9.89
3D body "PLS-1Rr.stp": height 7.99, standoff -3, extent 1.27,-1.27 3.81,9.89
3D body "PLS-1R.step": height 5.45, standoff -3, extent 1.27,1.27 3.81,9.89

## PLD-20RR2 [mm] "Connector; Header; 10x2 Position"
height 5
pads (20):
  rect 1.5x1.5 hole 0.9: 1(0,0)
  round 1.5 hole 0.9: 2(0,2.54) 3(2.54,0) 4(2.54,2.54) 5(5.08,0) 6(5.08,2.54) 7(7.62,0) 8(7.62,2.54) 9(10.16,0) 10(10.16,2.54) 11(12.7,0) 12(12.7,2.54) 13(15.24,0) 14(15.24,2.54) 15(17.78,0) 16(17.78,2.54) 17(20.32,0) 18(20.32,2.54) 19(22.86,0) 20(22.86,2.54)
Top Overlay:
  lines w0.2: -0.423,6.858 -0.423,12.277 0,12.7 0.423,12.277 0.423,6.858 ; 2.117,6.858 2.117,12.277 2.54,12.7 2.963,12.277 2.963,6.858 ; 4.657,6.858 4.657,12.277 5.08,12.7 5.503,12.277 5.503,6.858 ; 7.197,6.858 7.197,12.277 7.62,12.7 8.043,12.277 8.043,6.858 ; 9.737,6.858 9.737,12.277 10.16,12.7 10.583,12.277 10.583,6.858 ; 12.277,6.858 12.277,12.277 12.7,12.7 13.123,12.277 13.123,6.858 ; 14.817,6.858 14.817,12.277 15.24,12.7 15.663,12.277 15.663,6.858 ; 17.357,6.858 17.357,12.277 17.78,12.7 18.203,12.277 18.203,6.858 ; 19.897,6.858 19.897,12.277 20.32,12.7 20.743,12.277 20.743,6.858 ; 22.437,6.858 22.437,12.277 22.86,12.7 23.283,12.277 23.283,6.858 ; 24.13,3.81 -1.27,3.81 ; -1.27,3.81 -1.27,-1.27 24.13,-1.27 24.13,6.858 -1.27,6.858 -1.27,3.81
3D body "PLD-R2.stp": height 5.08, standoff -2.6, extent 21.59,-0.324 24.13,12.516
3D body "PLD-R2.stp": height 5.08, standoff -2.6, extent 3.81,-0.324 6.35,12.516
3D body "PLD-R2.stp": height 5.08, standoff -2.6, extent 1.27,-0.324 3.81,12.516
3D body "PLD-R2.stp": height 5.08, standoff -2.6, extent -1.27,-0.324 1.27,12.516
3D body "PLD-R2.stp": height 5.08, standoff -2.6, extent 11.43,-0.324 13.97,12.516
3D body "PLD-R2.stp": height 5.08, standoff -2.6, extent 8.89,-0.324 11.43,12.516
3D body "PLD-R2.stp": height 5.08, standoff -2.6, extent 6.35,-0.324 8.89,12.516
3D body "PLD-R2.stp": height 5.08, standoff -2.6, extent 19.05,-0.324 21.59,12.516
3D body "PLD-R2.stp": height 5.08, standoff -2.6, extent 16.51,-0.324 19.05,12.516
3D body "PLD-R2.stp": height 5.08, standoff -2.6, extent 13.97,-0.324 16.51,12.516